# Altium footprint library Display device.PcbLib: 47 footprints (part 1 of 3)
Each footprint in its own frame and in the unit in brackets; x right, y up, seen from the top. Pads: shape width x height; smd on the part's side, far side on the other; paste and mask are expansions set on the pad; w line width, h text height; cw(c..) or ccw(c..) is an arc to the next point about the centre after c.
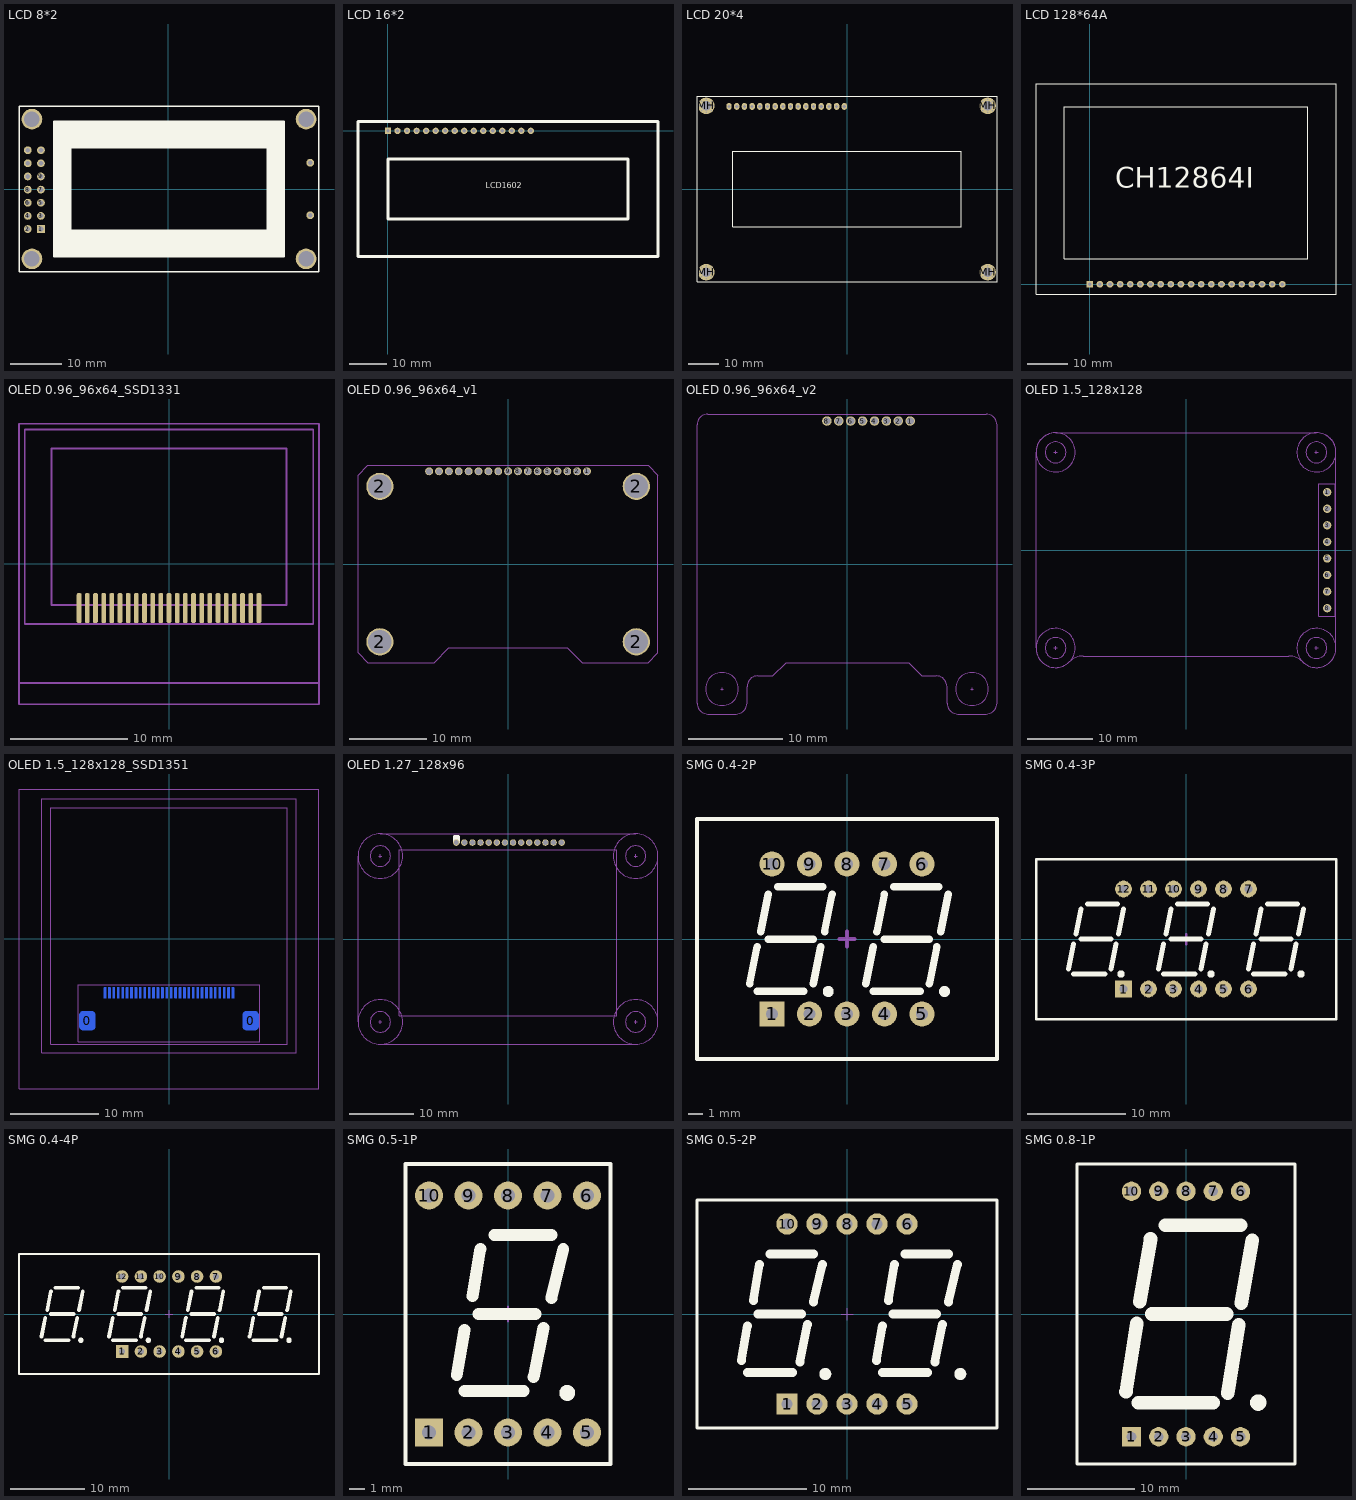
[diagram p0: the footprints below, top view; thin cyan lines are the x and y axes]

## LCD 8*2 [mm] "LCD module 8x2 char"
pads (20):
  rect 1.5x1.5 hole 0.9: 1(-24.61,-7.74)
  round 1.5 hole 0.9: 2(-27.15,-7.74) 3(-24.61,-5.2) 4(-27.15,-5.2) 5(-24.61,-2.66) 6(-27.15,-2.66) 7(-24.61,-0.12) 8(-27.15,-0.12) 9(-24.61,2.42) 10(-27.15,2.42) 11(-24.61,4.96) 12(-27.15,4.96) 13(-24.61,7.5) 14(-27.15,7.5) 15(27.45,5.08) 16(27.45,-5.08)
  round 4 hole 3: ""(-26.35,-13.5) ""(-26.35,13.5) ""(26.65,-13.5) ""(26.65,13.5)
Top Overlay:
  rectangle: -22.1,8 22.4,13.1
  rectangle: -22.1,-13.1 22.4,-8
  rectangle: -22.1,-8 -18.85,8
  region: 22.4,8 19.15,8 19.15,-8 22.4,-8
  lines w0.254: -28.85,-16 29.15,-16 29.15,16 -28.85,16 -28.85,-16 ; -22.1,-13.1 22.4,-13.1 22.4,13.1 -22.1,13.1 -22.1,-13.1 ; -18.85,-8 -18.85,8 19.15,8 19.15,-8 -18.85,-8

## LCD 16*2 [mm] "LCD module 16x2 char"
pads (16):
  rect 1.7x1.7 hole 0.9: 1(0,0)
  round 1.7 hole 0.9: 2(2.54,0) 3(5.08,0) 4(7.62,0) 5(10.16,0) 6(12.7,0) 7(15.24,0) 8(17.78,0) 9(20.32,0) 10(22.86,0) 11(25.4,0) 12(27.94,0) 13(30.48,0) 14(33.02,0) 15(35.56,0) 16(38.1,0)
Top Overlay:
  lines w0.762: -8,-33.5 72,-33.5 72,2.5 -8,2.5 -8,-33.5 ; 0,-23.5 64,-23.5 64,-7.5 0,-7.5 0,-23.5
  text "LCD1602" at 26.036,-15.28 h1.52
3D body "1602LCD.STEP": height 9, standoff -3.7, extent -8.147,-33.11 71.853,1.89

## LCD 20*4 [mm] "LCD module 20x4 char"
height 10.95
pads (52):
  oval 1.778x2.286 hole 1.016: 1(-39,27.3) 2(-36.46,27.3) 3(-33.92,27.3) 4(-31.38,27.3) 5(-28.84,27.3) 6(-26.3,27.3) 7(-23.76,27.3) 8(-21.22,27.3) 9(-18.68,27.3) 10(-16.14,27.3) 11(-13.6,27.3) 12(-11.06,27.3) 13(-8.52,27.3) 14(-5.98,27.3) 15(-3.44,27.3) 16(-0.9,27.3)
  round 1 hole 0.5: MH(-48.7,-27.5) MH(-48.7,27.5) MH(-48.056,-29.056) MH(-48.056,-25.944) MH(-48.056,25.944) MH(-48.056,29.056) MH(-46.5,-29.7) MH(-46.5,-25.3) MH(-46.5,25.3) MH(-46.5,29.7) MH(-44.944,-29.056) MH(-44.944,-25.944) MH(-44.944,25.944) MH(-44.944,29.056) MH(-44.3,-27.5) MH(-44.3,27.5) MH(44.3,-27.5) MH(44.3,27.5) MH(44.944,-29.056) MH(44.944,-25.944) MH(44.944,25.944) MH(44.944,29.056) MH(46.5,-29.7) MH(46.5,-25.3) MH(46.5,25.3) MH(46.5,29.7) MH(48.056,-29.056) MH(48.056,-25.944) MH(48.056,25.944) MH(48.056,29.056) MH(48.7,-27.5) MH(48.7,27.5)
  round 5.5 hole 3.2: MH(-46.5,-27.5) MH(-46.5,27.5) MH(46.5,-27.5) MH(46.5,27.5)
Top Overlay:
  lines w0.254: -49.6,-30.6 -49.6,30.6 49.6,30.6 49.6,-30.6 -49.6,-30.6 ; -37.8,-12.5 -37.8,12.5 37.8,12.5 37.8,-12.5 -37.8,-12.5
3D body "14801-15 H.STEP": height 18.71, standoff -3.71, extent 44.2,25.2 48.8,29.8
3D body "14801-15 H.STEP": height 18.71, standoff -3.71, extent 44.2,-29.8 48.8,-25.2
3D body "14801-15 H.STEP": height 18.71, standoff -3.71, extent -48.8,-29.8 -44.2,-25.2
3D body "header16-15mm.STEP": height 18.03, standoff -2.54, extent -40.27,26.03 0.37,28.57
3D body "User Library-LCD 20 x 4.STEP": height 26.17, standoff 15.07, extent -49,-30 49,30
3D body "14801-15 H.STEP": height 18.71, standoff -3.71, extent -48.8,25.2 -44.2,29.8

## LCD 128*64A [mm] "75*52.7mm"
pads (20):
  rect 1.7x1.7 hole 0.9: 1(0,0)
  round 1.7 hole 0.9: 2(2.54,0) 3(5.08,0) 4(7.62,0) 5(10.16,0) 6(12.7,0) 7(15.24,0) 8(17.78,0) 9(20.32,0) 10(22.86,0) 11(25.4,0) 12(27.94,0) 13(30.48,0) 14(33.02,0) 15(35.56,0) 16(38.1,0) 17(40.64,0) 18(43.18,0) 19(45.72,0) 20(48.26,0)
Top Overlay:
  lines w0.254: -13.462,-2.54 61.722,-2.54 61.722,50.292 -13.462,50.292 -13.462,-2.54 ; -6.35,6.35 54.61,6.35 54.61,44.45 -6.35,44.45 -6.35,6.35
  text "CH12864I" at 6.35,24.13 h5.08
3D body "HDR1x20.STEP": height 8.54, standoff -3, extent -1.27,-1.27 49.53,1.27
3D body "LCD 128x64.STEP": height 7.93, standoff -0.57, extent -13.345,-2.489 61.655,50.211

## OLED 0.96_96x64_SSD1331 [mil]
pads (23):
  rrect50% 16x100 smd: 1(303.15,-150) 2(275.59,-150) 3(248.03,-150) 4(220.47,-150) 5(192.91,-150) 6(165.35,-150) 7(137.8,-150) 8(110.24,-150) 9(82.68,-150) 10(55.12,-150) 11(27.56,-150) 12(0,-150) 13(-27.56,-150) 14(-55.12,-150) 15(-82.68,-150) 16(-110.24,-150) 17(-137.8,-150) 18(-165.35,-150) 19(-192.91,-150) 20(-220.47,-150) 21(-248.03,-150) 22(-275.59,-150) 23(-303.15,-150)
Mechanical 13:
  lines w6: -505.91,-402.4 505.91,-402.4 ; -505.91,-402.4 -505.91,471.61 505.91,471.61 505.91,-402.4 ; -505.91,-402.4 -505.91,-474.45 505.91,-474.45 505.91,-402.4 ; -486.22,-203.58 486.22,-203.58 486.22,451.93 -486.22,451.93 -486.22,-203.58 ; -396.46,-140 -396.46,388.35 396.46,388.35 396.46,-140 -396.46,-140
3D body "User Library-096OLED.STEP": height 24.42, standoff -126.58, extent -525.58,-398.28 525.6,476.38

## OLED 0.96_96x64_v1 [mil]
pads (21):
  round 40 hole 30: 1(400.45,469.72) 2(350.45,469.72) 3(300.45,469.72) 4(250.45,469.72) 5(200.45,469.72) 6(150.45,469.72) 7(100.45,469.72) 8(50.45,469.72) 9(0.45,469.72) 10(-49.55,469.72) 11(-99.55,469.72) 12(-149.55,469.72) 13(-199.55,469.72) 14(-249.55,469.73) 15(-299.55,469.73) 16(-349.55,469.73) 17(-399.55,469.73)
  round 137.8 hole 118.11 mask+0: 2(-649.15,-393.98) 2(-649.15,393.43) 2(650.06,-393.98) 2(650.06,393.43)
Mechanical 13:
  lines w2: -760,-449.82 -760,450.18 -710,500.18 710,500.18 760,450.18 760,-449.82 710,-499.82 375,-499.82 300.45,-425.27 -299.55,-425.27 -374.09,-499.82 -710,-499.82 -760,-449.82

## OLED 0.96_96x64_v2 [mil]
pads (8):
  round 40 hole 30: 1(265.45,600.55) 2(215.45,600.55) 3(165.45,600.55) 4(115.45,600.55) 5(65.45,600.55) 6(15.45,600.55) 7(-34.55,600.55) 8(-84.55,600.55)
Mechanical 13:
  circle w2: c-525,-525 r69
  circle w2: c525,-525 r69
  lines w2: -530,-525 -520,-525 ; -525,-530 -525,-520 ; 520,-525 530,-525 ; 525,-530 525,-520 ; -630,-585 ccw(c-585,-585) -585,-630 -465,-630 ccw(c-465,-585) -420,-585 -420,-515 cw(c-375,-515) -375,-470 -310.91,-470 -255.45,-414.55 259.55,-414.55 315,-470 375,-470 cw(c375,-515) 420,-515 420,-585 ccw(c465,-585) 465,-630 585,-630 ccw(c585,-585) 630,-585 630,585 ccw(c585,585) 585,630 -585,630 ccw(c-585,585) -630,585 -630,-585
3D body "female_header_a-bl127-eg-z08d.stp": height 133.86, standoff -94.49, extent -117.43,565.11 298.32,635.98

## OLED 1.5_128x128 [mil]
pads (8):
  round 50 hole 32: 1(852.4,350) 2(852.4,250) 3(852.4,150) 4(852.4,50) 5(852.4,-50) 6(852.4,-150) 7(852.4,-250) 8(852.4,-350)
Mechanical 13:
  circle w2: c787.4,590.55 r63
  circle w2: c787.4,590.55 r118.11
  circle w2: c-787.4,590.55 r63
  circle w2: c-787.4,590.55 r118.11
  circle w2: c-787.4,-590.55 r63
  circle w2: c-787.4,-590.55 r118.11
  circle w2: c787.4,-590.55 r63
  circle w2: c787.4,-590.55 r118.11
  lines w2: -797.4,-590.55 -777.4,-590.55 ; -797.4,590.55 -777.4,590.55 ; -787.4,-600.55 -787.4,-580.55 ; -787.4,580.55 -787.4,600.55 ; 777.4,-590.55 797.4,-590.55 ; 777.4,590.55 797.4,590.55 ; 787.4,-600.55 787.4,-580.55 ; 787.4,580.55 787.4,600.55 ; -905.51,-590.55 ccw(c-905.51,-590.55) -905.51,-590.55 ; -905.51,-590.55 ccw(c-787.4,-590.55) -787.4,-708.66 ccw(c-787.4,-590.55) -703.89,-674.07 cw(c-620.37,-757.58) -620.37,-639.47 620.37,-639.47 ; -905.51,-590.55 -905.51,590.55 cw(c-787.4,590.55) -787.4,708.66 787.4,708.66 cw(c787.4,590.55) 905.51,590.55 ; 620.37,-639.47 cw(c620.37,-757.58) 703.89,-674.07 ccw(c787.4,-590.55) 787.4,-708.66 ccw(c787.4,-590.55) 905.51,-590.55 905.51,590.55 ; 620.37,-639.47 620.37,-639.47 ; 905.51,590.55 ccw(c905.51,590.55) 905.51,590.55 ; 802.4,-400 802.4,400 902.4,400 902.4,-400 802.4,-400
Mechanical 14:
  lines w2: 802.4,-400 902.4,-400 902.4,400 802.4,400 802.4,-400
3D body "QCopterRCsE_OLED_Pcb.step": height -138.58, standoff -579.53, extent -905.51,-708.67 905.51,708.66
3D body "female_header_a-bl254-eg-g08d.stp": height 334.65, standoff -125.98, extent 803.19,-404.84 901.62,405

## OLED 1.5_128x128_SSD1351 [mil]
pads (32):
  rrect50% 72x86 smd far side: 0(-364.06,-364.37) 0(364.05,-364.37)
  rrect50% 10x50 smd far side: 1(-285.43,-240.39) 2(-265.75,-240.39) 3(-246.06,-240.39) 4(-226.38,-240.39) 5(-206.69,-240.39) 6(-187.01,-240.39) 7(-167.32,-240.39) 8(-147.64,-240.39) 9(-127.95,-240.39) 10(-108.27,-240.39) 11(-88.58,-240.39) 12(-68.9,-240.39) 13(-49.21,-240.39) 14(-29.53,-240.39) 15(-9.84,-240.39) 16(9.84,-240.39) 17(29.53,-240.39) 18(49.21,-240.39) 19(68.9,-240.39) 20(88.58,-240.39) 21(108.27,-240.39) 22(127.95,-240.39) 23(147.64,-240.39) 24(167.32,-240.39) 25(187.01,-240.39) 26(206.69,-240.39) 27(226.38,-240.39) 28(246.06,-240.39) 29(265.75,-240.39) 30(285.43,-240.39)
Bottom Overlay:
  lines w10: -364.06,-419.37 -364.06,-454.37 364.05,-454.37 364.05,-419.37 ; -364.06,-309.37 -364.06,-254.37 -304.06,-254.37 ; 304.05,-254.37 364.05,-254.37 364.05,-309.37
Mechanical 13:
  lines w2: -669.29,-669.29 -669.29,669.29 669.29,669.29 669.29,-669.29 -669.29,-669.29 ; -566.93,-507.87 -566.93,625.98 566.93,625.98 566.93,-507.87 -566.93,-507.87 ; -527.56,-468.5 527.56,-468.5 527.56,586.61 -527.56,586.61 -527.56,-468.5
Mechanical 14:
  lines w2: -404.06,-459.37 404.05,-459.37 404.05,-204.37 -404.06,-204.37 -404.06,-459.37
3D body: height 39.37, standoff 0, extent -669.29,-669.29 669.29,669.29
3D body: height 62.99, standoff 23.62, extent -527.56,-468.5 527.56,586.61

## OLED 1.27_128x96 [mil]
pads (14):
  round 40 hole 30: 1(-319.09,594.69) 2(-269.09,594.69) 3(-219.09,594.69) 4(-169.09,594.69) 5(-119.09,594.69) 6(-69.09,594.69) 7(-19.09,594.69) 8(30.91,594.69) 9(80.91,594.69) 10(130.91,594.69) 11(180.91,594.69) 12(230.91,594.69) 13(280.91,594.69) 14(330.91,594.69)
Top Overlay:
  region: -299.09,634.69 -299.09,594.69 -304.09,594.69 -304.38,597.61 -306.62,603.02 -310.76,607.16 -316.17,609.4 -319.09,609.69 -322.02,609.4 -327.43,607.16 -331.57,603.02 -333.81,597.61 -334.09,594.69 -339.1,594.69 -339.1,634.68 -334.09,639.69 -304.09,639.69
Bottom Overlay:
  region: -299.09,634.69 -299.09,594.69 -304.09,594.69 -304.38,597.61 -306.62,603.02 -310.76,607.16 -316.17,609.4 -319.09,609.68 -319.09,609.69 -322.02,609.4 -327.43,607.16 -331.57,603.02 -333.81,597.61 -334.09,594.69 -339.1,594.69 -339.1,634.68 -334.09,639.69 -304.09,639.69
Mechanical 13:
  circle w2: c787.4,511.81 r137.8
  circle w2: c787.4,-511.81 r137.8
  circle w2: c-787.4,-511.81 r137.8
  circle w2: c-787.4,511.81 r137.8
  circle w2: c-787.4,511.81 r63
  circle w2: c787.4,511.81 r63
  circle w2: c787.4,-511.81 r63
  circle w2: c-787.4,-511.81 r63
  lines w2: -797.4,-511.81 -777.4,-511.81 ; -797.4,511.81 -777.4,511.81 ; -787.4,-649.61 cw(c-787.4,-511.81) -925.2,-511.81 ; -787.4,-521.81 -787.4,-501.81 ; -787.4,501.81 -787.4,521.81 ; -787.32,-649.61 787.4,-649.61 ccw(c787.4,-511.81) 925.2,-511.81 925.2,511.81 ccw(c787.4,511.81) 787.4,649.61 -787.4,649.61 ccw(c-787.4,511.81) -925.2,511.81 -925.2,-511.81 ; 777.4,-511.81 797.4,-511.81 ; 777.4,511.81 797.4,511.81 ; 787.4,-521.81 787.4,-501.81 ; 787.4,501.81 787.4,521.81 ; -925.2,-511.81 -925.2,-511.81 ; -669.29,-472.44 669.29,-472.44 669.29,551.18 -669.29,551.18 -669.29,-472.44

## SMG 0.4-2P [mm] "20.1*16*7mm(ï¿½ï¿½ï¿½ï¿½ï¿½)"
pads (10):
  rect 1.7x1.7 hole 0.8: 1(-5.08,-5.08)
  round 1.7 hole 0.8: 2(-2.54,-5.08) 3(0,-5.08) 4(2.54,-5.08) 5(5.08,-5.08) 6(5.08,5.08) 7(2.54,5.08) 8(0,5.08) 9(-2.54,5.08) 10(-5.08,5.08)
Top Overlay:
  circle w0.381: c6.604,-3.556 r0.18
  circle w0.381: c-1.27,-3.556 r0.18
  lines w0.254: -10.16,-8.128 -10.16,8.128 10.16,8.128 10.16,-8.128 -10.16,-8.128
  lines w0.508: -6.604,-3.048 -6.096,-0.508 ; -6.096,-3.556 -2.921,-3.556 ; -5.842,0.508 -5.334,3.048 ; -4.699,3.556 -1.651,3.556 ; -2.286,-3.048 -1.778,-0.508 ; -1.524,0.508 -1.016,3.048 ; 1.27,-3.048 1.778,-0.508 ; 1.778,-3.556 4.953,-3.556 ; 2.032,0.508 2.54,3.048 ; 3.175,3.556 6.223,3.556 ; 5.588,-3.048 6.096,-0.508 ; 6.35,0.508 6.858,3.048 ; -5.334,0 -2.286,0 -5.334,0 ; 2.54,0 5.588,0 2.54,0
Mechanical 15:
  lines w0.254: -0.508,0 0.508,0 ; 0,-0.508 0,0.508
3D body "SMG 0.4-2P.STEP": height 7, standoff -3.6, extent -10.05,-8 10.05,8

## SMG 0.4-3P [mm] "30.1*16*7mm(ï¿½ï¿½ï¿½ï¿½ï¿½)"
pads (12):
  rect 1.7x1.7 hole 0.8: 1(-6.35,-5.08)
  round 1.7 hole 0.8: 2(-3.81,-5.08) 3(-1.27,-5.08) 4(1.27,-5.08) 5(3.81,-5.08) 6(6.35,-5.08) 7(6.35,5.08) 8(3.81,5.08) 9(1.27,5.08) 10(-1.27,5.08) 11(-3.81,5.08) 12(-6.35,5.08)
Top Overlay:
  circle w0.381: c11.684,-3.556 r0.18
  circle w0.381: c2.54,-3.556 r0.18
  circle w0.381: c-6.604,-3.556 r0.18
  lines w0.254: -15.24,-8.128 15.24,-8.128 15.24,8.128 -15.24,8.128 -15.24,-8.128
  lines w0.508: -11.938,-3.048 -11.43,-0.508 ; -11.43,-3.556 -8.255,-3.556 ; -11.176,0.508 -10.668,3.048 ; -10.668,0 -7.62,0 ; -10.033,3.556 -6.985,3.556 ; -7.62,-3.048 -7.112,-0.508 ; -6.858,0.508 -6.35,3.048 ; -2.794,-3.048 -2.286,-0.508 ; -2.286,-3.556 0.889,-3.556 ; -2.032,0.508 -1.524,3.048 ; -0.889,3.556 2.159,3.556 ; 1.524,-3.048 2.032,-0.508 ; 2.286,0.508 2.794,3.048 ; 6.35,-3.048 6.858,-0.508 ; 6.858,-3.556 10.033,-3.556 ; 7.112,0.508 7.62,3.048 ; 8.255,3.556 11.303,3.556 ; 10.668,-3.048 11.176,-0.508 ; 11.43,0.508 11.938,3.048 ; -1.524,0 1.524,0 -1.524,0 ; 7.62,0 10.668,0 7.62,0
Mechanical 15:
  lines w0.254: -0.508,0 0.508,0 ; 0,-0.508 0,0.508
3D body "SMG 0.4-3P.STEP": height 7, standoff -3.6, extent -15.05,-8 15.05,8

## SMG 0.4-4P [mm] "40.5*16*7mm(ï¿½ï¿½ï¿½ï¿½ï¿½)"
pads (12):
  rect 1.7x1.7 hole 0.8: 1(-6.35,-5.08)
  round 1.7 hole 0.8: 2(-3.81,-5.08) 3(-1.27,-5.08) 4(1.27,-5.08) 5(3.81,-5.08) 6(6.35,-5.08) 7(6.35,5.08) 8(3.81,5.08) 9(1.27,5.08) 10(-1.27,5.08) 11(-3.81,5.08) 12(-6.35,5.08)
Top Overlay:
  circle w0.381: c-2.794,-3.556 r0.18
  circle w0.381: c-11.938,-3.556 r0.18
  circle w0.381: c16.256,-3.556 r0.18
  circle w0.381: c7.112,-3.556 r0.18
  lines w0.254: -20.32,-8.128 -20.32,8.128 20.32,8.128 20.32,-8.128 -20.32,-8.128
  lines w0.508: -17.272,-3.048 -16.764,-0.508 ; -16.764,-3.556 -13.589,-3.556 ; -16.51,0.508 -16.002,3.048 ; -16.002,0 -12.954,0 ; -15.367,3.556 -12.319,3.556 ; -12.954,-3.048 -12.446,-0.508 ; -12.192,0.508 -11.684,3.048 ; -8.128,-3.048 -7.62,-0.508 ; -7.62,-3.556 -4.445,-3.556 ; -7.366,0.508 -6.858,3.048 ; -6.223,3.556 -3.175,3.556 ; -3.81,-3.048 -3.302,-0.508 ; -3.048,0.508 -2.54,3.048 ; 1.778,-3.048 2.286,-0.508 ; 2.286,-3.556 5.461,-3.556 ; 2.54,0.508 3.048,3.048 ; 3.048,0 6.096,0 ; 3.683,3.556 6.731,3.556 ; 6.096,-3.048 6.604,-0.508 ; 6.858,0.508 7.366,3.048 ; 10.922,-3.048 11.43,-0.508 ; 11.43,-3.556 14.605,-3.556 ; 11.684,0.508 12.192,3.048 ; 12.827,3.556 15.875,3.556 ; 15.24,-3.048 15.748,-0.508 ; 16.002,0.508 16.51,3.048 ; -6.858,0 -3.81,0 -6.858,0 ; 12.192,0 15.24,0 12.192,0
Mechanical 15:
  lines w0.1: -0.508,0 0.508,0 ; 0,-0.508 0,0.508
3D body "SMG 0.4-4P.STEP": height 7, standoff -3.6, extent -20.25,-8 20.25,8

## SMG 0.5-1P [mm] "12.7*19*8mm(ï¿½ï¿½ï¿½ï¿½ï¿½)"
pads (10):
  rect 1.8x1.8 hole 0.9: 1(-5.08,-7.62)
  round 1.8 hole 0.9: 2(-2.54,-7.62) 3(0,-7.62) 4(2.54,-7.62) 5(5.08,-7.62) 6(5.08,7.62) 7(2.54,7.62) 8(0,7.62) 9(-2.54,7.62) 10(-5.08,7.62)
Top Overlay:
  circle w0.508: c3.81,-5.08 r0.254
  lines w0.254: -6.604,-9.652 -6.604,9.652 6.604,9.652 6.604,-9.652 -6.604,-9.652
  lines w0.762: -3.302,-3.937 -2.794,-1.016 ; -2.794,-4.953 1.016,-4.953 ; -2.286,1.143 -1.778,4.191 ; -1.905,0 1.778,0 ; -0.889,5.08 2.794,5.08 ; 1.651,-4.064 2.286,-0.889 ; 2.794,1.016 3.556,4.191
Mechanical 15:
  lines w0.1: -0.508,0 0.508,0 ; 0,-0.508 0,0.508
3D body "SMG 0.5-1P.STEP": height 8, standoff -3.6, extent -6.35,-9.5 6.35,9.5

## SMG 0.5-2P [mm] "25*19*8mm(ï¿½ï¿½ï¿½ï¿½ï¿½)"
pads (10):
  rect 1.8x1.8 hole 0.9: 1(-5.08,-7.62)
  round 1.8 hole 0.9: 2(-2.54,-7.62) 3(0,-7.62) 4(2.54,-7.62) 5(5.08,-7.62) 6(5.08,7.62) 7(2.54,7.62) 8(0,7.62) 9(-2.54,7.62) 10(-5.08,7.62)
Top Overlay:
  circle w0.508: c9.588,-5.08 r0.254
  circle w0.508: c-1.841,-5.08 r0.254
  lines w0.254: -12.7,-9.652 12.7,-9.652 12.7,9.652 -12.7,9.652 -12.7,-9.652
  lines w0.762: -8.954,-3.937 -8.445,-1.016 ; -8.445,-4.953 -4.635,-4.953 ; -7.938,1.143 -7.429,4.191 ; -7.556,0 -3.873,0 ; -6.54,5.08 -2.857,5.08 ; -4,-4.064 -3.365,-0.889 ; -2.857,1.016 -2.095,4.191 ; 2.476,-3.937 2.984,-1.016 ; 2.984,-4.953 6.794,-4.953 ; 3.492,1.143 4,4.191 ; 3.873,0 7.556,0 ; 4.889,5.08 8.572,5.08 ; 7.429,-4.064 8.064,-0.889 ; 8.572,1.016 9.335,4.191
Mechanical 15:
  lines w0.1: -0.508,0 0.508,0 ; 0,-0.508 0,0.508
3D body "SMG 0.5-2P.STEP": height 8, standoff -3.6, extent -12.5,-9.5 12.5,9.5

## SMG 0.8-1P [mm] "20*27.7*10mm(ï¿½ï¿½ï¿½ï¿½ï¿½)"
pads (10):
  rect 1.8x1.8 hole 0.9: 1(-5.08,-11.43)
  round 1.8 hole 0.9: 2(-2.54,-11.43) 3(0,-11.43) 4(2.54,-11.43) 5(5.08,-11.43) 6(5.08,11.43) 7(2.54,11.43) 8(0,11.43) 9(-2.54,11.43) 10(-5.08,11.43)
Top Overlay:
  circle w0.762: c6.731,-8.255 r0.381
  lines w0.254: -10.16,-13.97 -10.16,13.97 10.16,13.97 10.16,-13.97 -10.16,-13.97
  lines w1.27: -5.588,-7.239 -4.572,-0.889 ; -4.445,-8.255 2.54,-8.255 ; -4.318,1.143 -3.302,6.985 ; -3.175,0 3.81,0 ; -1.905,8.255 5.08,8.255 ; 3.891,-7.366 4.907,-1.016 ; 5.161,1.016 6.177,6.858
Mechanical 15:
  lines w0.1: -0.508,0 0.508,0 ; 0,-0.508 0,0.508
3D body "SMG 0.8-1P.STEP": height 10, standoff -3.1, extent -10,-13.85 10,13.85